# Altium footprint library PCBLIB.PcbLib: 557 footprints (part 5 of 36)
Each footprint in its own frame and in the unit in brackets; x right, y up, seen from the top. Pads: shape width x height; smd on the part's side, far side on the other; paste and mask are expansions set on the pad; w line width, h text height; cw(c..) or ccw(c..) is an arc to the next point about the centre after c.
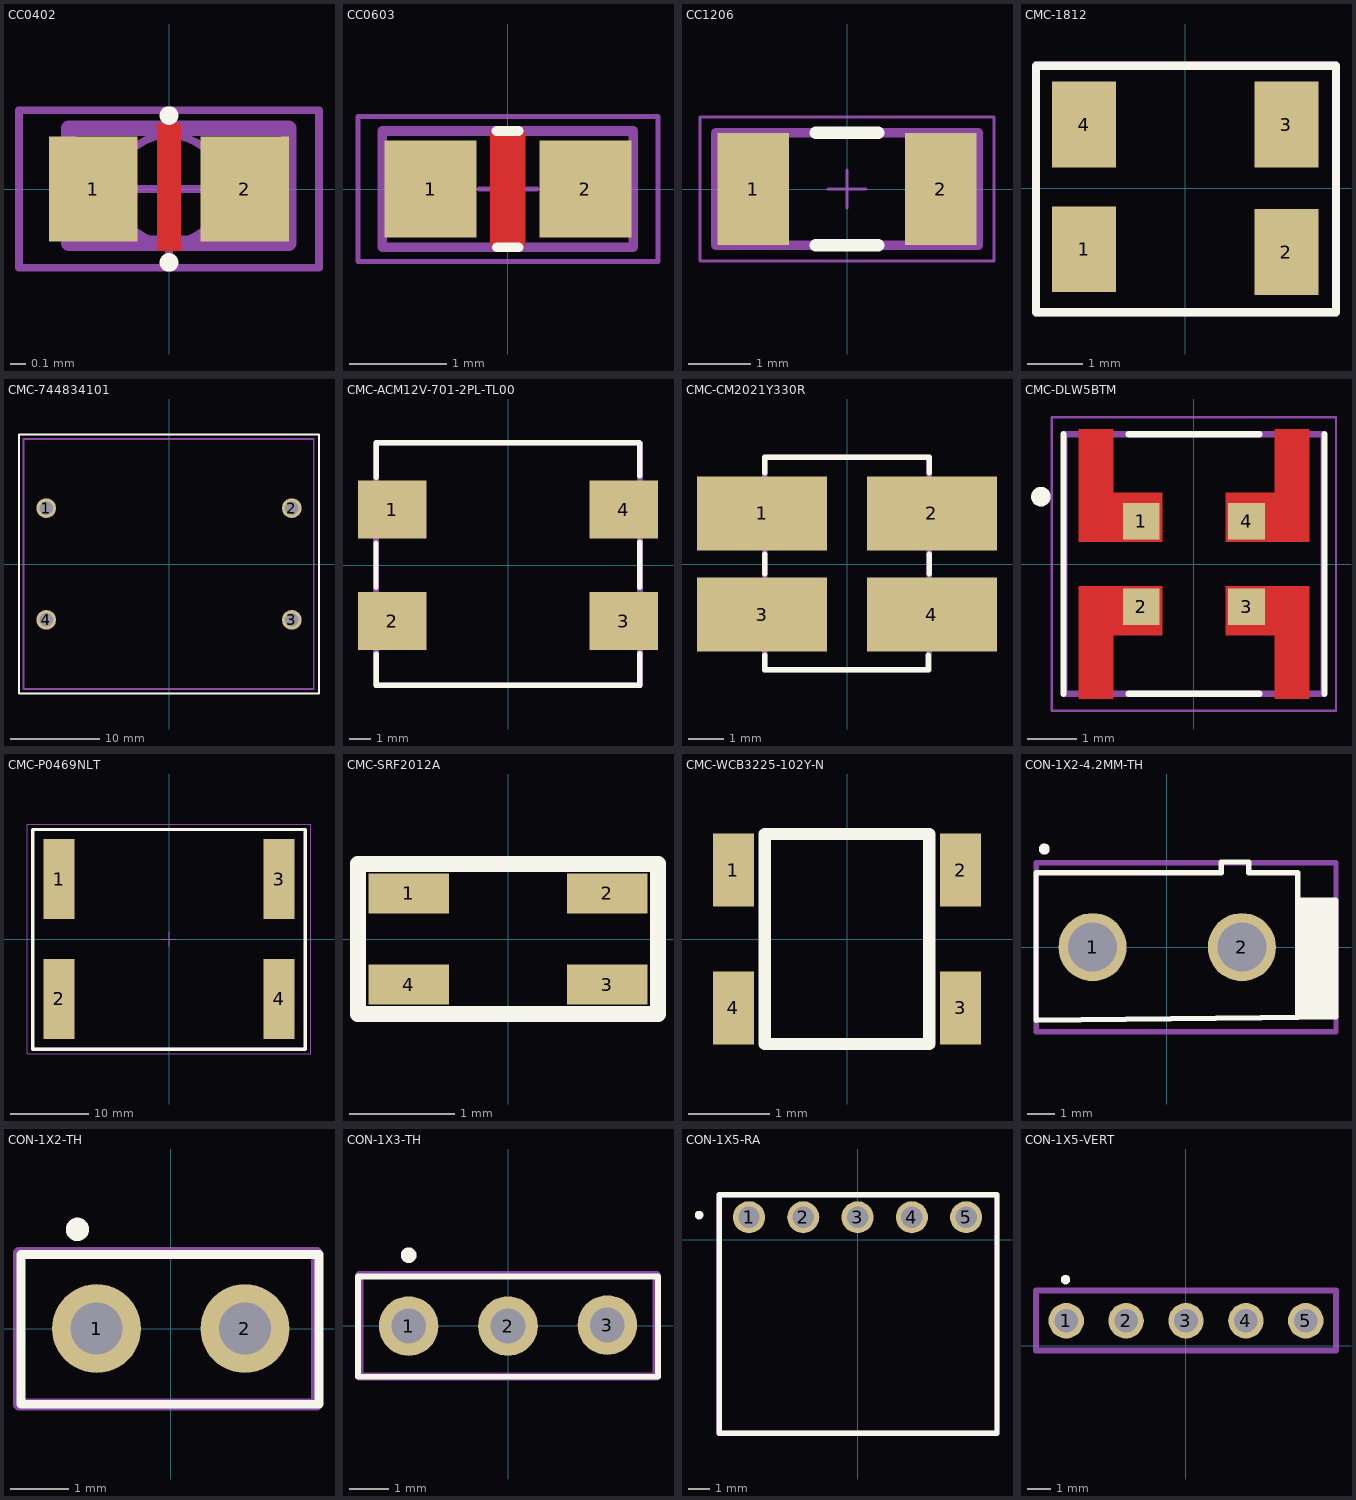
[diagram p4: the footprints below, top view; thin cyan lines are the x and y axes]

## CC0402 [mm]
pads (2):
  rect 0.57x0.68 smd: 1(-0.49,0) 2(0.49,0)
Top Layer:
  pour cut-out: -0.075,0.425 -0.075,-0.4 0.075,-0.4 0.075,0.425
Top Overlay:
  circle w0.1: c0,0.475 r0.01
  circle w0.1: c0,-0.475 r0.01
Mechanical 15:
  circle w0.05: c0,0 r0.35
  lines w0.05: -0.5,0 0.5,0 ; 0,-0.5 0,0.5 ; -0.97,-0.51 0.97,-0.51 0.97,0.51 -0.97,0.51 -0.97,-0.51
ASM Top:
  lines w0.1: -0.648,-0.35 0.775,-0.35 0.775,0.393 -0.648,0.393 -0.648,-0.35
  text ".designator" at -0.299,-0.183 h0.8
3D body "CAPC1005X55N EIA 0402.step": height 0.51, standoff 0.01, extent -0.517,-0.264 0.483,0.286

## CC0603 [mm]
pads (2):
  rect 0.95x1 smd: 1(-0.8,0) 2(0.8,0)
Top Layer:
  pour cut-out: -0.184,0.591 -0.184,-0.586 0.177,-0.586 0.177,0.591
Top Overlay:
  lines w0.1: -0.118,0.6 0.112,0.6 ; -0.116,-0.6 0.112,-0.6
Mechanical 15:
  lines w0.05: -0.3,0 0.3,0 ; 0,-0.3 0,0.3 ; -1.55,-0.75 1.55,-0.75 1.55,0.75 -1.55,0.75 -1.55,-0.75
ASM Top:
  lines w0.1: -1.3,-0.6 -1.3,0.6 1.294,0.6 1.294,-0.6 -1.3,-0.6
  text ".designator" at -0.4,-0.3 h0.8
3D body "CAPC1508X65N EIA 0603.step": height 0.66, standoff 0.01, extent -0.756,-0.4 0.744,0.4

## CC1206 [mm]
pads (2):
  rect 1.15x1.8 smd: 1(-1.5,0) 2(1.5,0)
Top Overlay:
  lines w0.2: -0.5,-0.9 0.5,-0.9 ; -0.5,0.9 0.5,0.9
Mechanical 15:
  lines w0.05: -0.3,0 0.3,0 ; 0,-0.3 0,0.3 ; -2.35,-1.15 2.35,-1.15 2.35,1.15 -2.35,1.15 -2.35,-1.15
ASM Top:
  lines w0.152: -2.1,-0.9 2.1,-0.9 2.1,0.9 -2.1,0.9 -2.1,-0.9
  text ".designator" at -0.7,-0.3 h0.8
3D body "CAPC3215X168N EIA 1206.step": height 1.51, standoff 0.01, extent -1.6,-0.842 1.6,0.838

## CMC-1812 [mm]
pads (4):
  rect 1.15x1.55 smd: 1(-1.825,-1.1) 2(1.825,-1.15) 3(1.825,1.15) 4(-1.825,1.15)
Top Overlay:
  lines w0.15: -2.692,-2.235 2.718,-2.235 2.718,2.21 -2.692,2.21 -2.692,-2.235
ASM Top:
  lines w0.15: -2.692,-2.235 -2.692,2.21 2.718,2.21 2.718,-2.235 -2.692,-2.235
  text ".designator" at -0.3,-0.1 h0.8
3D body "STEP-WE-CNSW-1812-rev1.stp": height 2.81, standoff -0.04, extent -2.25,-1.6 2.25,1.6

## CMC-744834101 [mm]
pads (4):
  round 2.2 hole 1.5: 1(-13.75,6.25) 2(13.75,6.25) 3(13.75,-6.25) 4(-13.75,-6.25)
Top Overlay:
  lines w0.254: -16.8,-14.5 16.8,-14.5 16.8,14.5 -16.8,14.5 -16.8,-14.5
ASM Top:
  lines w0.2: -16.3,-14 16.2,-14 16.2,14 -16.3,14 -16.3,-14
  text ".designator" at 0.5,0.6 h0.8
3D body "L-744834101 (rev1).stp": height 20.01, standoff -2.99, extent -16.25,-14 16.25,14

## CMC-ACM12V-701-2PL-TL00 [mm] "CMC 8A 2LN 700 OHM SMD AEC-Q200"
height 6
pads (4):
  rect 3.2x2.7 smd: 1(-5.4,2.6) 2(-5.4,-2.6) 3(5.4,-2.6) 4(5.4,2.6)
Top Overlay:
  lines w0.254: -6.16,-1.029 -6.16,1.033 ; -6.158,4.103 -6.158,5.729 -6.139,5.71 6.132,5.71 6.142,5.7 6.142,4.174 ; -6.151,-4.157 -6.151,-5.606 ; 6.149,-4.132 6.149,-5.6 6.143,-5.606 -6.151,-5.606 ; 6.152,-1.035 6.152,1.086 ; -6.151,-5.606 -6.151,-5.606
Top 3D Body:
  lines w0.254: -6.15,-5.608 6.15,-5.608 6.15,5.692 -6.15,5.71 -6.15,-5.608
ASM Top:
  lines w0.2: -6.2,-5.6 -6.2,5.7 6.2,5.7 6.2,-5.6 -6.2,-5.6
  text ".designator" at -1.8,-0.2 h0.8
3D body "acm12v.step": height 5.41, standoff -0.14, extent -6.002,-5.456 5.998,5.544

## CMC-CM2021Y330R [mil]
pads (4):
  rect 144x82 smd mask+0: 1(-94,56) 2(94,56) 3(-94,-56) 4(94,-56)
Top Overlay:
  lines w6: -91,-101 -91,-117 90,-117 90,-101 ; -91,-11 -91,11 ; -91,101 -91,118 91,118 91,101 ; 91,-11 91,11
ASM Top:
  lines w6: -91,-117 -91,118 91,118 91,-116 91,-117 -91,-117
  text ".designator" at -31.5,-3.94 h31.5
3D body "CM2021Y330R-10.STEP": height 150.11, standoff 0.5, extent -165.49,-112 166,112.41

## CMC-DLW5BTM [mm]
height 2.8
pads (4):
  rect 0.75x0.75 smd: 1(-1.075,0.875) 2(-1.075,-0.875) 3(1.075,-0.875) 4(1.075,0.875)
Top Layer:
  region: 2.35,-0.45 2.35,-2.75 1.65,-2.75 1.65,-1.45 0.65,-1.45 0.65,-0.45
  region: -1.65,2.75 -1.65,1.45 -0.65,1.45 -0.65,0.45 -2.35,0.45 -2.35,2.75
  region: 1.65,1.45 1.65,2.75 2.35,2.75 2.35,0.45 0.65,0.45 0.65,1.45
  region: -0.65,-0.45 -0.65,-1.45 -1.65,-1.45 -1.65,-2.75 -2.35,-2.75 -2.35,-0.45
Top Overlay:
  circle w0.2: c-3.125,1.375 r0.1
  lines w0.127: -2.663,-2.65 -2.663,2.65 ; -1.336,-2.65 1.336,-2.65 ; -1.336,2.65 1.336,2.65 ; 2.663,-2.65 2.663,2.65
Mechanical 15:
  lines w0.05: -2.9,-3 2.9,-3 2.9,3 -2.9,3 -2.9,-3
ASM Top:
  circle w0.2: c-3.125,1.375 r0.1
  lines w0.127: -2.65,-2.65 -2.65,2.65 2.65,2.65 2.65,-2.65 -2.65,-2.65
  text ".designator" at -1.3,-0.3 h0.8
3D body "DLW5BTM102TQ2K--3DModel-STEP-1.STEP": height 2.51, standoff 0.01, extent -2.5,-2.5 2.5,2.5

## CMC-P0469NLT [mm]
pads (4):
  rect 3.94x10.16 smd: 1(-13.97,7.62) 2(-13.97,-7.62) 3(13.97,7.62) 4(13.97,-7.62)
Top Overlay:
  lines w0.4: -17.3,-14 -17.3,13.9 17.3,13.9 17.3,-14 -17.3,-14
Mechanical 15:
  lines w0.15: -0.9,0 0,0 ; 0,-0.9 0,0 ; 0,0.9 0,0 ; 0.9,0 0,0 ; -18,-14.6 18,-14.6 18,14.6 -18,14.6 -18,-14.6
ASM Top:
  lines w0.2: -17.3,-13.9 -17.3,13.9 17.3,13.9 17.3,-13.9 -17.3,-13.9
  text ".designator" at 0.1,-0.2 h0.8
3D body: height 11.7, standoff 1, extent -17,-13.6 17,13.6

## CMC-SRF2012A [mil]
pads (4):
  rect 30x15 smd mask+1.97: 1(-37,17) 2(37,17) 3(37,-17) 4(-37,-17)
Top Overlay:
  lines w6: -56,-28 -56,28 56,28 56,-28 -56,-28
ASM Top:
  lines w6: -56,-28 56,-28 56,28 -56,28 -56,-28
  text ".designator" at -37,-17 h31.5
3D body "User Library-SRF2012A.STEP": height 47.73, standoff 0.76, extent -40.74,-23.62 38,23.62

## CMC-WCB3225-102Y-N [mm]
pads (4):
  rect 0.5x0.9 smd mask+0.051: 1(-1.4,0.85) 2(1.4,0.85) 3(1.4,-0.85) 4(-1.4,-0.85)
Top Overlay:
  lines w0.152: -1.016,-1.295 1.016,-1.295 1.016,1.295 -1.016,1.295 -1.016,-1.295
ASM Top:
  lines w0.1: -1.016,-1.295 1.016,-1.295 1.016,1.295 -1.016,1.295 -1.016,-1.295
  text ".designator" at -0.152,0 h0.8
3D body "1206USB.STEP": height 1.94, standoff 0.01, extent -1.66,-0.784 1.66,0.936

## CON-1X2-4.2MM-TH [mm]
pads (2):
  round 2.5 hole 1.8: 1(-2.725,0) 2(2.75,0)
Top Overlay:
  circle w0.2: c-4.499,3.6 r0.1
  rectangle: 4.8,-2.55 6.2,1.725
  lines w0.2: 4.8,-2.575 4.8,1.725 ; 4.8,1.725 4.8,2.725 3,2.725 3,3.124 1.99,3.124 1.99,2.725 -4.802,2.725 -4.802,-2.672 3.45,-2.588 6.2,-2.55 6.2,1.725 4.8,1.725
ASM Top:
  lines w0.2: -4.8,-3.1 -4.8,3.1 6.2,3.1 6.2,-3.1 -4.8,-3.1
  text ".designator" at -1.493,-0.212 h0.8
3D body "039281023.stp": height 12.61, standoff -3.69, extent -4.8,-3.1 6.2,3.1

## CON-1X2-TH [mil]
pads (2):
  round 60 hole 35: 1(-50,0) 2(50,0)
Top Overlay:
  circle w7.87: c-62.96,66.93 r3.94
  lines w6: -101,-51 100,-51 100,50 -101,50 -101,-51
ASM Top:
  lines w7.87: -102.36,-51.18 98.43,-51.18 98.43,51.18 -102.36,51.18 -102.36,-51.18
  text ".designator" at -15.75,-7.87 h31.5
3D body "1x2 TH Pitch 2_54mm.STEP": height 373.85, standoff -125.98, extent -100,-51 100,49

## CON-1X3-TH [mil]
pads (3):
  round 60 hole 35: 1(-100,-0.5) 2(0,-0.5) 3(100,0.5)
Top Overlay:
  circle w7.87: c-99.98,70.87 r3.94
  lines w6: -151,-51.5 -151,49.5 151,49.5 151,-51.5 -151,-51.5
ASM Top:
  lines w7.87: -149.61,-51.18 -149.61,51.18 149.61,51.18 149.61,-51.18 -149.61,-51.18
  text ".designator" at -39.37,-3.94 h31.5
3D body "61300311121_Download_STP_61300311121_rev1.stp": height 336.72, standoff -117.61, extent -150.01,-50 149.99,50

## CON-1X5-RA [mm]
pads (5):
  round 1.5 hole 1: 1(-5.07,1.06) 2(-2.535,1.06) 3(0,1.06) 4(2.535,1.06) 5(5.07,1.06)
Top Overlay:
  circle w0.2: c-7.399,1.16 r0.1
  circle w0.2: c0.001,1.16 r0.1
  lines w0.254: -6.47,-9.03 6.51,-9.03 6.51,2.11 -6.47,2.11 -6.47,-9.03
ASM Top:
  lines w0.254: -6.47,-9.03 -6.47,2.11 6.51,2.11 6.51,-9.03 -6.47,-9.03
  text ".designator" at -0.457,-2.337 h0.8
3D body "61300511021 (rev1).stp": height 2.55, standoff -2.99, extent -6.32,-8.9 6.38,1.46

## CON-1X5-VERT [mm]
pads (5):
  round 1.5 hole 1: 1(-5.07,1.06) 2(-2.535,1.06) 3(0,1.06) 4(2.535,1.06) 5(5.07,1.06)
Top Overlay:
  circle w0.2: c-5.1,2.8 r0.1
ASM Top:
  lines w0.254: -6.35,-0.21 6.35,-0.21 6.35,2.33 -6.35,2.33 -6.35,-0.21
  text ".designator" at 0,1.06 h0.8
3D body "Download_STP_61300511121 (rev1).stp": height 8.05, standoff -3.49, extent -6.35,-0.21 6.35,2.33